# Altium footprint library Inductor.PcbLib: 25 footprints (part 2 of 2)
Each footprint in its own frame and in the unit in brackets; x right, y up, seen from the top. Pads: shape width x height; smd on the part's side, far side on the other; paste and mask are expansions set on the pad; w line width, h text height; cw(c..) or ccw(c..) is an arc to the next point about the centre after c.
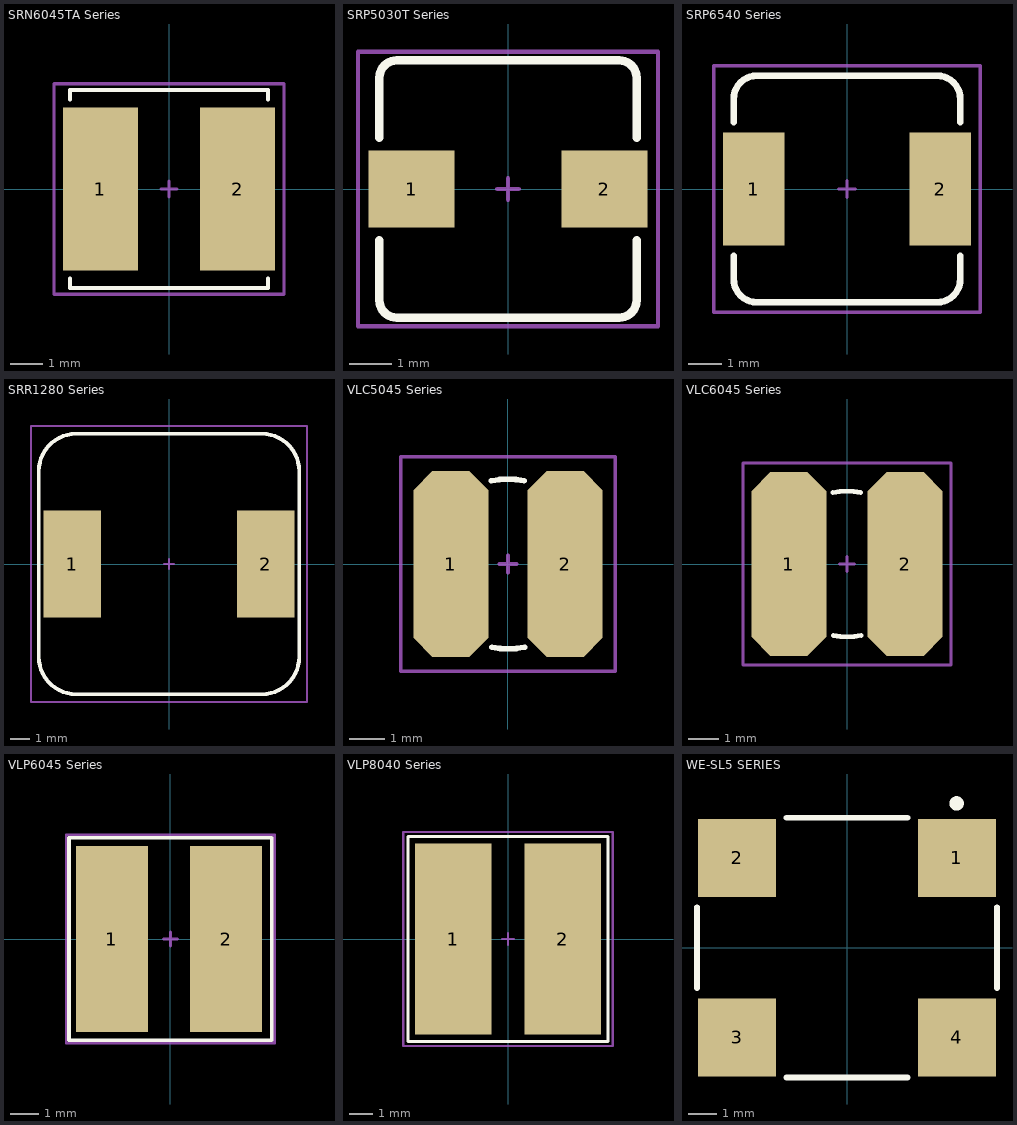
[diagram p1: the footprints below, top view; thin cyan lines are the x and y axes]

## SRN6045TA Series [mm]
height 4.2
pads (2):
  rect 2.35x5.1 smd: 1(-2.15,0) 2(2.15,0)
Top Overlay:
  lines w0.127: -3.1,-2.8 -3.1,-3.1 3.1,-3.1 3.1,-2.8 ; -3.1,2.8 -3.1,3.1 3.1,3.1 3.1,2.8
Mechanical 15:
  lines w0.1: -0.25,0 0.25,0 ; 0,-0.25 0,0.25 ; -3.6,-3.3 3.6,-3.3 3.6,3.3 -3.6,3.3 -3.6,-3.3
3D body "SRN6045TA Series.STEP": height 4.2, standoff 0, extent -3,-3 3,3

## SRP5030T Series [mm]
height 2.8
pads (2):
  rect 2x1.8 smd: 1(-2.25,0) 2(2.25,0)
Top Overlay:
  lines w0.2: -3,-1.2 -3,-2.6 ccw(c-2.6,-2.6) -2.6,-3 2.6,-3 ccw(c2.6,-2.6) 3,-2.6 3,-1.2 ; -3,1.2 -3,2.6 cw(c-2.6,2.6) -2.6,3 2.6,3 cw(c2.6,2.6) 3,2.6 3,1.2
Mechanical 15:
  lines w0.1: -0.25,0 0.25,0 ; 0,-0.25 0,0.25 ; -3.5,-3.2 -3.5,3.2 3.5,3.2 3.5,-3.2 -3.5,-3.2
3D body "User Library-SRP-5030 Inductor.step": height 2.8, standoff 0, extent -3,-2.85 3,2.85

## SRP6540 Series [mm]
height 4
pads (2):
  rect 1.85x3.4 smd: 1(-2.8,0) 2(2.8,0)
Top Overlay:
  lines w0.2: -3.4,-2 -3.4,-2.7 ccw(c-2.7,-2.7) -2.7,-3.4 2.7,-3.4 ccw(c2.7,-2.7) 3.4,-2.7 3.4,-2 ; -3.4,2 -3.4,2.7 cw(c-2.7,2.7) -2.7,3.4 2.7,3.4 cw(c2.7,2.7) 3.4,2.7 3.4,2
Mechanical 15:
  lines w0.1: -0.25,0 0.25,0 ; 0,-0.25 0,0.25 ; -4,-3.7 -4,3.7 4,3.7 4,-3.7 -4,-3.7
3D body "User Library-SRP6540 coil.step": height 4.19, standoff 0.07, extent -3.366,-3.25 3.366,3.252

## SRR1280 Series [mm]
height 7.5
pads (2):
  rect 2.9x5.4 smd: 1(-4.9,0) 2(4.9,0)
Top Overlay:
  lines w0.2: -6.6,-4.7 ccw(c-4.7,-4.7) -4.7,-6.6 4.7,-6.6 ccw(c4.7,-4.7) 6.6,-4.7 6.6,4.7 ccw(c4.7,4.7) 4.7,6.6 -4.7,6.6 ccw(c-4.7,4.7) -6.6,4.7 -6.6,-4.7
Mechanical 15:
  lines w0.1: -0.25,0 0.25,0 ; 0,-0.25 0,0.25 ; -7,-7 7,-7 7,7 -7,7 -7,-7
3D body "Inductor SRR1280 Series.STEP": height 7.51, standoff 0, extent -6.25,-6.25 6.25,6.25

## VLC5045 Series [mm]
height 4.5
pads (2):
  oct 2.1x5.2 smd: 1(-1.6,0) 2(1.6,0)
Top Overlay:
  lines w0.157: -0.466,2.331 cw(c0,0) 0.449,2.334 ; -0.449,-2.334 ccw(c0,0) 0.466,-2.331
Mechanical 15:
  lines w0.1: -0.25,0 0.25,0 ; 0,-0.25 0,0.25 ; -3,-3 -3,3 3,3 3,-3 -3,-3
3D body "Inductor VLC5045 Series.STEP": height 4.5, standoff 0, extent -2.5,-2.5 2.5,2.5

## VLC6045 Series [mm]
height 4.5
pads (2):
  oct 2.45x6 smd: 1(-1.9,0) 2(1.9,0)
Top Overlay:
  lines w0.157: -0.466,2.331 cw(c0,0) 0.449,2.334 ; -0.449,-2.334 ccw(c0,0) 0.466,-2.331
Mechanical 15:
  lines w0.1: -0.25,0 0.25,0 ; 0,-0.25 0,0.25 ; -3.4,-3.3 -3.4,3.3 3.4,3.3 3.4,-3.3 -3.4,-3.3
3D body "Inductor VLC6045 Series.STEP": height 4.5, standoff 0, extent -3,-3 3,3

## VLP6045 Series [mm]
height 4
pads (2):
  rect 2.55x6.6 smd: 1(-2.075,0) 2(1.975,0)
Top Overlay:
  lines w0.127: -3.6,-3.6 -3.6,3.6 3.6,3.6 3.6,-3.6 -3.6,-3.6
Mechanical 15:
  lines w0.1: -0.25,0 0.25,0 ; 0,-0.25 0,0.25 ; -3.7,-3.7 -3.7,3.7 3.7,3.7 3.7,-3.7 -3.7,-3.7
3D body "VLP6045T.STEP": height 4.5, standoff 0, extent -3,-3 3,3

## VLP8040 Series [mm]
height 4
pads (2):
  rect 3.3x8.2 smd: 1(-2.35,0) 2(2.35,0)
Top Overlay:
  lines w0.127: -4.3,-4.4 4.3,-4.4 4.3,4.4 -4.3,4.4 -4.3,-4.4
Mechanical 15:
  lines w0.1: -0.25,0 0.25,0 ; 0,-0.25 0,0.25 ; -4.5,-4.6 4.5,-4.6 4.5,4.6 -4.5,4.6 -4.5,-4.6
3D body "VLP8040T.STEP": height 4.2, standoff 0, extent -3.75,-3.95 3.75,3.95

## WE-SL5 SERIES [mm]
pads (4):
  rect 2.7x2.7 smd: 1(3.81,3.11) 2(-3.81,3.11) 3(-3.81,-3.11) 4(3.81,-3.11)
Top Overlay:
  circle w0.3: c3.8,5 r0.1
  lines w0.2: -5.2,-1.4 -5.2,1.4 ; -2.1,-4.5 2.1,-4.5 ; -2.1,4.5 2.1,4.5 ; 5.2,-1.4 5.2,1.4
3D body "744272251.stp": height 6, standoff 0, extent -5,-4.35 5,4.35